# Altium footprint library Reflow3D1411sep.PcbLib: 657 footprints (part 16 of 42)
Each footprint in its own frame and in the unit in brackets; x right, y up, seen from the top. Pads: shape width x height; smd on the part's side, far side on the other; paste and mask are expansions set on the pad; w line width, h text height; cw(c..) or ccw(c..) is an arc to the next point about the centre after c.
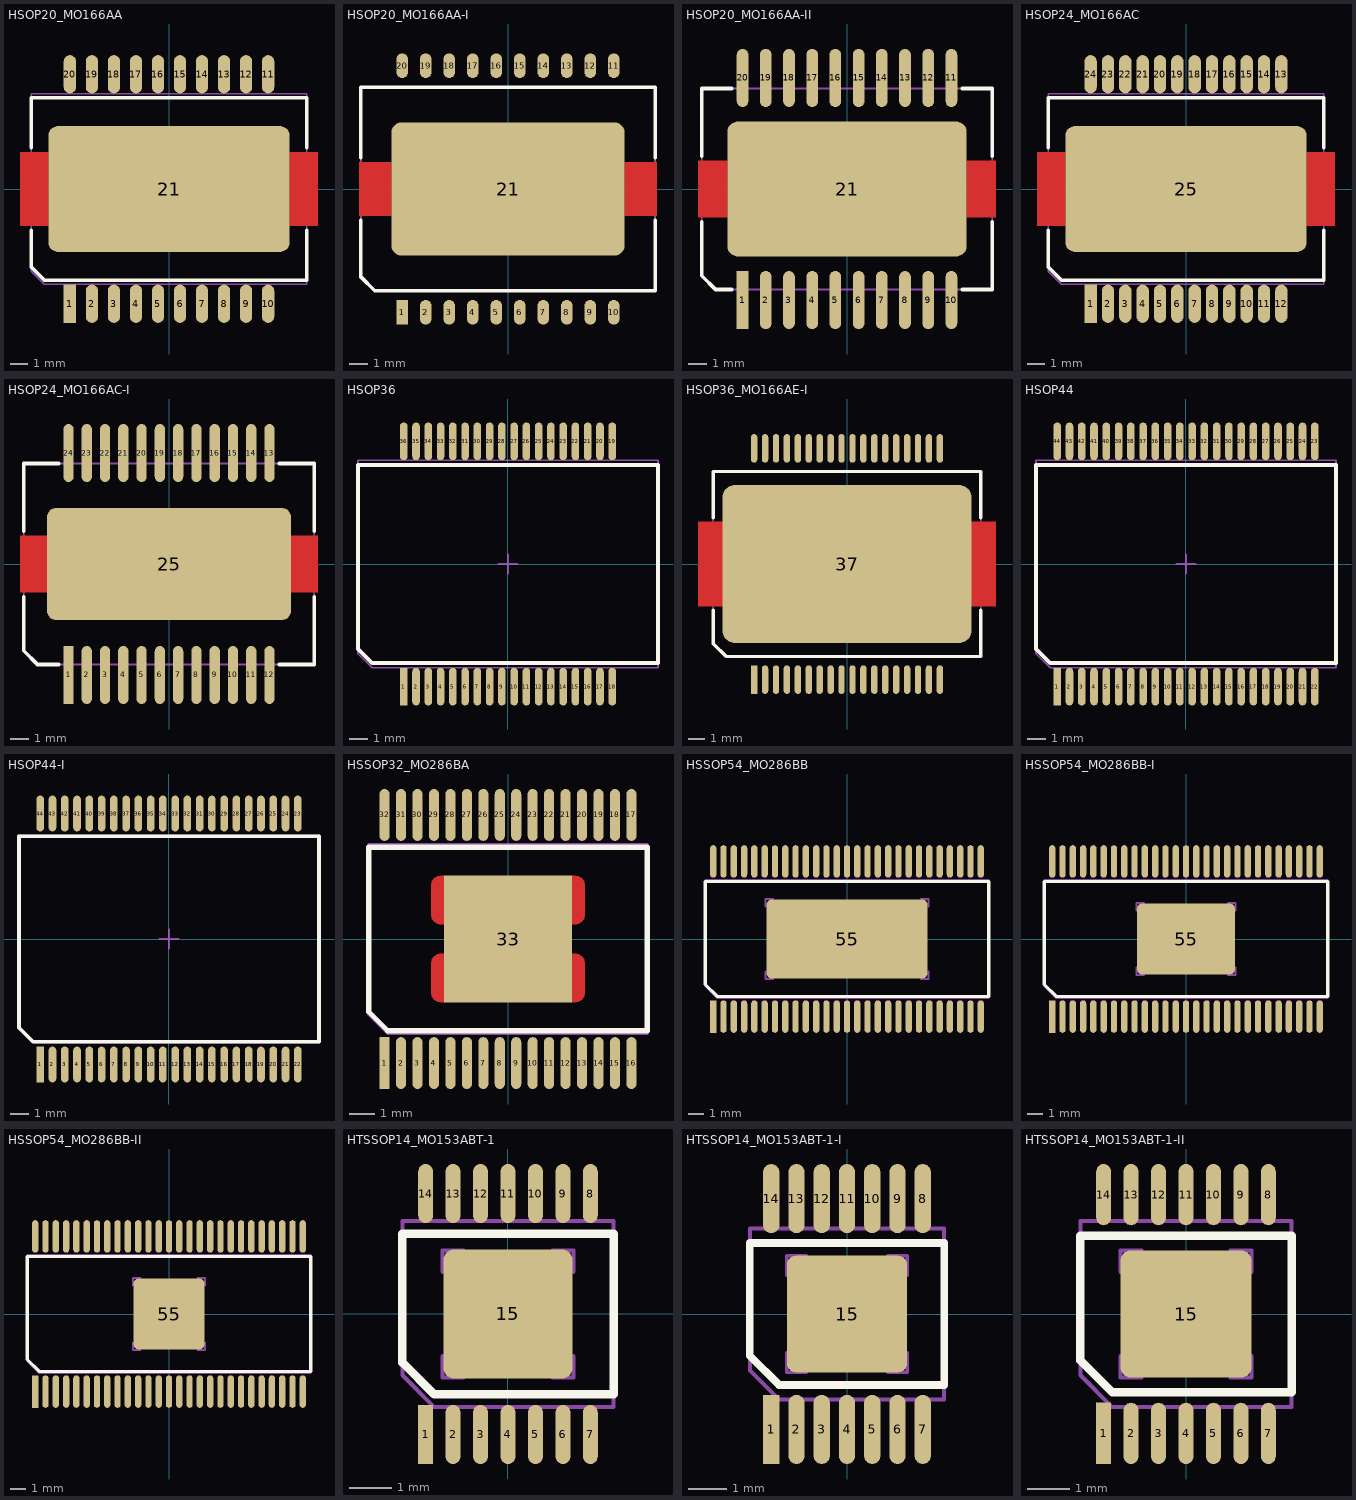
[diagram p15: the footprints below, top view; thin cyan lines are the x and y axes]

## HSOP20_MO166AA [mm] "www.intersil.com, M20.433.pdf; www.freescale.com, MC33186DHTAD.pdf; www.jedec.org, Mo-166D.pdf"
height 3.35
pads (21):
  rect 0.71x2.21 smd mask+0.075: 1(-5.715,-6.615)
  oval 0.71x2.21 smd mask+0.075: 2(-4.445,-6.615) 3(-3.175,-6.615) 4(-1.905,-6.615) 5(-0.635,-6.615) 6(0.635,-6.615) 7(1.905,-6.615) 8(3.175,-6.615) 9(4.445,-6.615) 10(5.715,-6.615) 11(5.715,6.615) 12(4.445,6.615) 13(3.175,6.615) 14(1.905,6.615) 15(0.635,6.615) 16(-0.635,6.615) 17(-1.905,6.615) 18(-3.175,6.615) 19(-4.445,6.615) 20(-5.715,6.615)
  rrect15% 13.92x7.26 smd paste-25.4 mask+0.075: 21(0,0)
Top Layer:
  region: -8.575,-2.11 -6.96,-2.11 -6.96,2.11 -8.575,2.11
  region: 8.575,2.11 6.96,2.11 6.96,-2.11 8.575,-2.11
Top Overlay:
  lines w0.2: -7.95,-2.375 -7.95,-4.5 -7.2,-5.25 7.95,-5.25 7.95,-2.375 ; -7.95,2.375 -7.95,5.25 7.95,5.25 7.95,2.375
Top Paste:
  drawing of 45 lines, arcs and shapes, not listed
Top Solder:
  region: -8.65,-2.185 -7.035,-2.185 -7.035,2.185 -8.65,2.185
  region: 8.65,2.185 7.035,2.185 7.035,-2.185 8.65,-2.185
Mechanical 13:
  lines w0.1: -6.4,-2.5 -6.4,-3 -5.9,-3 ; -6.4,2.5 -6.4,3 -5.9,3 ; 5.9,-3 6.4,-3 6.4,-2.5 ; 5.9,3 6.4,3 6.4,2.5 ; -7.95,-4.75 -7.95,5.5 7.95,5.5 7.95,-5.5 -7.2,-5.5 -7.95,-4.75
Mechanical 15:
  lines w0.1: -0.5,0 0.5,0 ; 0,-0.5 0,0.5
3D body: height 3.6, standoff 0, extent -8,-5.55 8,5.55

## HSOP20_MO166AA-I [mm] "www.onsemi.com, 525AB.PDF; www.freescale.com, MC33186DHTAD.pdf"
height 3.2
pads (21):
  rect 0.62x1.33 smd mask+0.075: 1(-5.715,-6.665)
  oval 0.62x1.33 smd mask+0.075: 2(-4.445,-6.665) 3(-3.175,-6.665) 4(-1.905,-6.665) 5(-0.635,-6.665) 6(0.635,-6.665) 7(1.905,-6.665) 8(3.175,-6.665) 9(4.445,-6.665) 10(5.715,-6.665) 11(5.715,6.665) 12(4.445,6.665) 13(3.175,6.665) 14(1.905,6.665) 15(0.635,6.665) 16(-0.635,6.665) 17(-1.905,6.665) 18(-3.175,6.665) 19(-4.445,6.665) 20(-5.715,6.665)
  rrect15% 12.6x7.2 smd paste-25.4 mask+0.075: 21(0,0)
Top Layer:
  region: -8.03,-1.45 -6.3,-1.45 -6.3,1.45 -8.03,1.45
  region: 6.3,-1.45 8.03,-1.45 8.03,1.45 6.3,1.45
Top Overlay:
  lines w0.2: -7.95,-1.7 -7.95,-4.75 -7.2,-5.5 7.95,-5.5 7.95,-1.7 ; -7.95,1.7 -7.95,5.5 7.95,5.5 7.95,1.7
Top Paste:
  drawing of 45 lines, arcs and shapes, not listed
Top Solder:
  region: -8.105,-1.525 -6.375,-1.525 -6.375,1.525 -8.105,1.525
  region: 6.375,-1.525 8.105,-1.525 8.105,1.525 6.375,1.525
Mechanical 13:
  lines w0.1: -6.075,-2.9 -6.075,-3.4 -5.575,-3.4 ; -6.075,2.9 -6.075,3.4 -5.575,3.4 ; 5.575,-3.4 6.075,-3.4 6.075,-2.9 ; 5.575,3.4 6.075,3.4 6.075,2.9 ; -7.95,-4.75 -7.95,5.5 7.95,5.5 7.95,-5.5 -7.2,-5.5 -7.95,-4.75
Mechanical 15:
  lines w0.1: -0.5,0 0.5,0 ; 0,-0.5 0,0.5
3D body: height 3.4, standoff 0, extent -8,-5.55 8,5.55

## HSOP20_MO166AA-II [mm] "www.cirrus.com, Apex_Pkg_DK_E.pdf; www.freescale.com, MC33186DHTAD.pdf"
height 3.2
pads (21):
  rect 0.64x3.18 smd mask+0.075: 1(-5.715,-6.08)
  oval 0.64x3.18 smd mask+0.075: 2(-4.445,-6.08) 3(-3.175,-6.08) 4(-1.905,-6.08) 5(-0.635,-6.08) 6(0.635,-6.08) 7(1.905,-6.08) 8(3.175,-6.08) 9(4.445,-6.08) 10(5.715,-6.08) 11(5.715,6.08) 12(4.445,6.08) 13(3.175,6.08) 14(1.905,6.08) 15(0.635,6.08) 16(-0.635,6.08) 17(-1.905,6.08) 18(-3.175,6.08) 19(-4.445,6.08) 20(-5.715,6.08)
  rrect15% 13.1x7.38 smd paste-25.4 mask+0.075: 21(0,0)
Top Layer:
  region: -8.135,-1.535 -6.555,-1.535 -6.555,1.535 -8.135,1.535
  region: 8.135,1.535 6.555,1.535 6.555,-1.535 8.135,-1.535
Top Overlay:
  lines w0.2: -7.95,-1.8 -7.95,-4.75 -7.2,-5.5 -6.3,-5.5 ; -7.95,1.8 -7.95,5.5 -6.3,5.5 ; 6.3,-5.5 7.95,-5.5 7.95,-1.8 ; 6.3,5.5 7.95,5.5 7.95,1.8
Top Paste:
  drawing of 45 lines, arcs and shapes, not listed
Top Solder:
  region: -8.21,-1.61 -6.63,-1.61 -6.63,1.61 -8.21,1.61
  region: 8.21,1.61 6.63,1.61 6.63,-1.61 8.21,-1.61
Mechanical 13:
  lines w0.1: -5.5,-2.75 -5.5,-3.25 -5,-3.25 ; -5.5,2.75 -5.5,3.25 -5,3.25 ; 5,-3.25 5.5,-3.25 5.5,-2.75 ; 5,3.25 5.5,3.25 5.5,2.75 ; -7.95,-4.75 -7.2,-5.5 7.95,-5.5 7.95,5.5 -7.95,5.5 -7.95,-4.75
Mechanical 15:
  lines w0.1: -0.5,0 0.5,0 ; 0,-0.5 0,0.5
3D body: height 3.4, standoff 0, extent -8,-5.55 8,5.55

## HSOP24_MO166AC [mm] "www.intersil.com, M24.433.pdf; www.freescale.com, MC33186DHTAD.pdf"
height 3.35
pads (25):
  rect 0.71x2.21 smd mask+0.075: 1(-5.5,-6.615)
  oval 0.71x2.21 smd mask+0.075: 2(-4.5,-6.615) 3(-3.5,-6.615) 4(-2.5,-6.615) 5(-1.5,-6.615) 6(-0.5,-6.615) 7(0.5,-6.615) 8(1.5,-6.615) 9(2.5,-6.615) 10(3.5,-6.615) 11(4.5,-6.615) 12(5.5,-6.615) 13(5.5,6.615) 14(4.5,6.615) 15(3.5,6.615) 16(2.5,6.615) 17(1.5,6.615) 18(0.5,6.615) 19(-0.5,6.615) 20(-1.5,6.615) 21(-2.5,6.615) 22(-3.5,6.615) 23(-4.5,6.615) 24(-5.5,6.615)
  rrect15% 13.92x7.26 smd paste-25.4 mask+0.075: 25(0,0)
Top Layer:
  region: -8.575,-2.11 -6.96,-2.11 -6.96,2.11 -8.575,2.11
  region: 8.575,2.11 6.96,2.11 6.96,-2.11 8.575,-2.11
Top Overlay:
  lines w0.2: -7.95,-2.375 -7.95,-4.5 -7.2,-5.25 7.95,-5.25 7.95,-2.375 ; -7.95,2.375 -7.95,5.25 7.95,5.25 7.95,2.375
Top Paste:
  drawing of 45 lines, arcs and shapes, not listed
Top Solder:
  region: -8.65,-2.185 -7.035,-2.185 -7.035,2.185 -8.65,2.185
  region: 8.65,2.185 7.035,2.185 7.035,-2.185 8.65,-2.185
Mechanical 13:
  lines w0.1: -6.4,-2.5 -6.4,-3 -5.9,-3 ; -6.4,2.5 -6.4,3 -5.9,3 ; 5.9,-3 6.4,-3 6.4,-2.5 ; 5.9,3 6.4,3 6.4,2.5 ; -7.95,-4.75 -7.95,5.5 7.95,5.5 7.95,-5.5 -7.2,-5.5 -7.95,-4.75
Mechanical 15:
  lines w0.1: -0.5,0 0.5,0 ; 0,-0.5 0,0.5
3D body: height 3.6, standoff 0, extent -8,-5.55 8,5.55

## HSOP24_MO166AC-I [mm] "www.cirrus.com, Apex_Pkg_DF.pdf; www.freescale.com, MC33186DHTAD.pdf; www.jedec.org, Mo-166D.pdf"
height 3.35
pads (25):
  rect 0.56x3.18 smd mask+0.075: 1(-5.5,-6.075)
  oval 0.56x3.18 smd mask+0.075: 2(-4.5,-6.075) 3(-3.5,-6.075) 4(-2.5,-6.075) 5(-1.5,-6.075) 6(-0.5,-6.075) 7(0.5,-6.075) 8(1.5,-6.075) 9(2.5,-6.075) 10(3.5,-6.075) 11(4.5,-6.075) 12(5.5,-6.075) 13(5.5,6.075) 14(4.5,6.075) 15(3.5,6.075) 16(2.5,6.075) 17(1.5,6.075) 18(0.5,6.075) 19(-0.5,6.075) 20(-1.5,6.075) 21(-2.5,6.075) 22(-3.5,6.075) 23(-4.5,6.075) 24(-5.5,6.075)
  rrect15% 13.34x6.13 smd paste-25.4 mask+0.075: 25(0,0)
Top Layer:
  region: 8.135,1.535 6.67,1.535 6.67,-1.535 8.135,-1.535
  region: -8.135,-1.535 -6.67,-1.535 -6.67,1.535 -8.135,1.535
Top Overlay:
  lines w0.2: -7.95,-1.8 -7.95,-4.75 -7.2,-5.5 -6.05,-5.5 ; -7.95,1.8 -7.95,5.5 -6.05,5.5 ; 6.05,-5.5 7.95,-5.5 7.95,-1.8 ; 6.05,5.5 7.95,5.5 7.95,1.8
Top Paste:
  drawing of 45 lines, arcs and shapes, not listed
Top Solder:
  region: 8.21,1.61 6.745,1.61 6.745,-1.61 8.21,-1.61
  region: -8.21,-1.61 -6.745,-1.61 -6.745,1.61 -8.21,1.61
Mechanical 13:
  lines w0.1: -5.5,-2.5 -5.5,-3 -5,-3 ; -5.5,2.5 -5.5,3 -5,3 ; 5,-3 5.5,-3 5.5,-2.5 ; 5,3 5.5,3 5.5,2.5 ; -7.95,-4.75 -7.95,5.5 7.95,5.5 7.95,-5.5 -7.2,-5.5 -7.95,-4.75
Mechanical 15:
  lines w0.1: -0.5,0 0.5,0 ; 0,-0.5 0,0.5
3D body: height 3.6, standoff 0, extent -8,-5.55 8,5.55

## HSOP36 [mm] "www.ti.com, tas5414a.pdf"
height 3.5
pads (36):
  rect 0.4x2 smd mask+0.05: 1(-5.525,-6.5)
  oval 0.4x2 smd mask+0.05: 2(-4.875,-6.5) 3(-4.225,-6.5) 4(-3.575,-6.5) 5(-2.925,-6.5) 6(-2.275,-6.5) 7(-1.625,-6.5) 8(-0.975,-6.5) 9(-0.325,-6.5) 10(0.325,-6.5) 11(0.975,-6.5) 12(1.625,-6.5) 13(2.275,-6.5) 14(2.925,-6.5) 15(3.575,-6.5) 16(4.225,-6.5) 17(4.875,-6.5) 18(5.525,-6.5) 19(5.525,6.5) 20(4.875,6.5) 21(4.225,6.5) 22(3.575,6.5) 23(2.925,6.5) 24(2.275,6.5) 25(1.625,6.5) 26(0.975,6.5) 27(0.325,6.5) 28(-0.325,6.5) 29(-0.975,6.5) 30(-1.625,6.5) 31(-2.275,6.5) 32(-2.925,6.5) 33(-3.575,6.5) 34(-4.225,6.5) 35(-4.875,6.5) 36(-5.525,6.5)
Top Overlay:
  lines w0.2: -7.95,-4.5 -7.2,-5.25 7.95,-5.25 7.95,5.25 -7.95,5.25 -7.95,-4.5
Mechanical 13:
  lines w0.1: -7.95,-4.75 -7.95,5.5 7.95,5.5 7.95,-5.5 -7.2,-5.5 -7.95,-4.75
Mechanical 15:
  lines w0.1: -0.5,0 0.5,0 ; 0,-0.5 0,0.5
3D body: height 3.6, standoff 0, extent -8,-5.55 8,5.55

## HSOP36_MO166AE-I [mm] "www.st.com, CD00003801.pdf; www.freescale.com, MC33186DHTAD.pdf; www.jedec.org, Mo-166D.pdf"
height 3.35
pads (37):
  rect 0.38x1.7 smd mask+0.075: 1(-5.525,-6.88)
  oval 0.38x1.7 smd mask+0.075: 2(-4.875,-6.88) 3(-4.225,-6.88) 4(-3.575,-6.88) 5(-2.925,-6.88) 6(-2.275,-6.88) 7(-1.625,-6.88) 8(-0.975,-6.88) 9(-0.325,-6.88) 10(0.325,-6.88) 11(0.975,-6.88) 12(1.625,-6.88) 13(2.275,-6.88) 14(2.925,-6.88) 15(3.575,-6.88) 16(4.225,-6.88) 17(4.875,-6.88) 18(5.525,-6.88) 19(5.525,6.88) 20(4.875,6.88) 21(4.225,6.88) 22(3.575,6.88) 23(2.925,6.88) 24(2.275,6.88) 25(1.625,6.88) 26(0.975,6.88) 27(0.325,6.88) 28(-0.325,6.88) 29(-0.975,6.88) 30(-1.625,6.88) 31(-2.275,6.88) 32(-2.925,6.88) 33(-3.575,6.88) 34(-4.225,6.88) 35(-4.875,6.88) 36(-5.525,6.88)
  rrect15% 14.8x9.4 smd paste-25.4 mask+0.075: 37(0,0)
Top Layer:
  region: -8.85,-2.5 -7.4,-2.5 -7.4,2.5 -8.85,2.5
  region: 8.85,2.5 7.4,2.5 7.4,-2.5 8.85,-2.5
Top Overlay:
  lines w0.2: -7.95,-2.75 -7.95,-4.75 -7.2,-5.5 7.95,-5.5 7.95,-2.75 ; -7.95,2.75 -7.95,5.5 7.95,5.5 7.95,2.75
Top Paste:
  drawing of 45 lines, arcs and shapes, not listed
Top Solder:
  region: -8.925,-2.575 -7.475,-2.575 -7.475,2.575 -8.925,2.575
  region: 8.925,2.575 7.475,2.575 7.475,-2.575 8.925,-2.575
Mechanical 13:
  lines w0.1: -4.8,-2.5 -4.8,-3 -4.3,-3 ; -4.8,2.5 -4.8,3 -4.3,3 ; 4.3,-3 4.8,-3 4.8,-2.5 ; 4.3,3 4.8,3 4.8,2.5 ; -7.95,-4.75 -7.95,5.5 7.95,5.5 7.95,-5.5 -7.2,-5.5 -7.95,-4.75
Mechanical 15:
  lines w0.1: -0.5,0 0.5,0 ; 0,-0.5 0,0.5
3D body: height 3.6, standoff 0, extent -8,-5.55 8,5.55

## HSOP44 [mm] "www.ti.com, tas5414a.pdf"
height 3.5
pads (44):
  rect 0.4x2 smd mask+0.05: 1(-6.825,-6.5)
  oval 0.4x2 smd mask+0.05: 2(-6.175,-6.5) 3(-5.525,-6.5) 4(-4.875,-6.5) 5(-4.225,-6.5) 6(-3.575,-6.5) 7(-2.925,-6.5) 8(-2.275,-6.5) 9(-1.625,-6.5) 10(-0.975,-6.5) 11(-0.325,-6.5) 12(0.325,-6.5) 13(0.975,-6.5) 14(1.625,-6.5) 15(2.275,-6.5) 16(2.925,-6.5) 17(3.575,-6.5) 18(4.225,-6.5) 19(4.875,-6.5) 20(5.525,-6.5) 21(6.175,-6.5) 22(6.825,-6.5) 23(6.825,6.5) 24(6.175,6.5) 25(5.525,6.5) 26(4.875,6.5) 27(4.225,6.5) 28(3.575,6.5) 29(2.925,6.5) 30(2.275,6.5) 31(1.625,6.5) 32(0.975,6.5) 33(0.325,6.5) 34(-0.325,6.5) 35(-0.975,6.5) 36(-1.625,6.5) 37(-2.275,6.5) 38(-2.925,6.5) 39(-3.575,6.5) 40(-4.225,6.5) 41(-4.875,6.5) 42(-5.525,6.5) 43(-6.175,6.5) 44(-6.825,6.5)
Top Overlay:
  lines w0.2: -7.95,-4.5 -7.95,5.25 7.95,5.25 7.95,-5.25 -7.2,-5.25 -7.95,-4.5
Mechanical 13:
  lines w0.1: -7.95,-4.75 -7.2,-5.5 7.95,-5.5 7.95,5.5 -7.95,5.5 -7.95,-4.75
Mechanical 15:
  lines w0.1: -0.5,0 0.5,0 ; 0,-0.5 0,0.5
3D body: height 3.6, standoff 0, extent -8,-5.55 8,5.55

## HSOP44-I [mm] "www.cirrus.com, Apex_Pkg_HU.pdf"
height 3.35
pads (44):
  rect 0.4x1.9 smd mask+0.05: 1(-6.825,-6.65)
  oval 0.4x1.9 smd mask+0.05: 2(-6.175,-6.65) 3(-5.525,-6.65) 4(-4.875,-6.65) 5(-4.225,-6.65) 6(-3.575,-6.65) 7(-2.925,-6.65) 8(-2.275,-6.65) 9(-1.625,-6.65) 10(-0.975,-6.65) 11(-0.325,-6.65) 12(0.325,-6.65) 13(0.975,-6.65) 14(1.625,-6.65) 15(2.275,-6.65) 16(2.925,-6.65) 17(3.575,-6.65) 18(4.225,-6.65) 19(4.875,-6.65) 20(5.525,-6.65) 21(6.175,-6.65) 22(6.825,-6.65) 23(6.825,6.65) 24(6.175,6.65) 25(5.525,6.65) 26(4.875,6.65) 27(4.225,6.65) 28(3.575,6.65) 29(2.925,6.65) 30(2.275,6.65) 31(1.625,6.65) 32(0.975,6.65) 33(0.325,6.65) 34(-0.325,6.65) 35(-0.975,6.65) 36(-1.625,6.65) 37(-2.275,6.65) 38(-2.925,6.65) 39(-3.575,6.65) 40(-4.225,6.65) 41(-4.875,6.65) 42(-5.525,6.65) 43(-6.175,6.65) 44(-6.825,6.65)
Top Overlay:
  lines w0.2: -7.95,-4.7 -7.95,5.45 7.95,5.45 7.95,-5.45 -7.2,-5.45 -7.95,-4.7
Mechanical 13:
  lines w0.1: -7.95,-4.75 -7.2,-5.5 7.95,-5.5 7.95,5.5 -7.95,5.5 -7.95,-4.75
Mechanical 15:
  lines w0.1: -0.5,0 0.5,0 ; 0,-0.5 0,0.5
3D body: height 3.6, standoff 0, extent -8,-5.55 8,5.55

## HSSOP32_MO286BA [mm] "www.freescale.com, MC33996.pdf, AN2409.pdf"
height 2.5
pads (33):
  rect 0.4x2.05 smd mask+0.05: 1(-4.875,-4.9)
  oval 0.4x2.05 smd mask+0.05: 2(-4.225,-4.9) 3(-3.575,-4.9) 4(-2.925,-4.9) 5(-2.275,-4.9) 6(-1.625,-4.9) 7(-0.975,-4.9) 8(-0.325,-4.9) 9(0.325,-4.9) 10(0.975,-4.9) 11(1.625,-4.9) 12(2.275,-4.9) 13(2.925,-4.9) 14(3.575,-4.9) 15(4.225,-4.9) 16(4.875,-4.9) 17(4.875,4.9) 18(4.225,4.9) 19(3.575,4.9) 20(2.925,4.9) 21(2.275,4.9) 22(1.625,4.9) 23(0.975,4.9) 24(0.325,4.9) 25(-0.325,4.9) 26(-0.975,4.9) 27(-1.625,4.9) 28(-2.275,4.9) 29(-2.925,4.9) 30(-3.575,4.9) 31(-4.225,4.9) 32(-4.875,4.9)
  rect 5.05x5 smd paste-25.4 mask+0.075: 33(0,0)
Top Layer:
  region: 2.525,-2.5 2.65,-2.507 2.796,-2.478 2.92,-2.395 3.003,-2.271 3.032,-2.125 3.025,-2.125 3.032,-0.95 3.003,-0.804 2.92,-0.68 2.796,-0.597 2.65,-0.568 2.65,-0.575 2.525,-0.575
  region: -2.525,2.5 -2.65,2.507 -2.796,2.478 -2.92,2.395 -3.003,2.271 -3.032,2.125 -3.025,2.125 -3.032,0.95 -3.003,0.804 -2.92,0.68 -2.796,0.597 -2.65,0.568 -2.65,0.575 -2.525,0.575
  region: 2.525,0.575 2.65,0.568 2.796,0.597 2.92,0.68 3.003,0.804 3.032,0.95 3.025,0.95 3.032,2.125 3.003,2.271 2.92,2.395 2.796,2.478 2.65,2.507 2.65,2.5 2.525,2.5
  region: -2.525,-0.575 -2.65,-0.568 -2.796,-0.597 -2.92,-0.68 -3.003,-0.804 -3.032,-0.95 -3.025,-0.95 -3.032,-2.125 -3.003,-2.271 -2.92,-2.395 -2.796,-2.478 -2.65,-2.507 -2.65,-2.5 -2.525,-2.5
Top Overlay:
  lines w0.2: -5.5,-2.875 -4.75,-3.625 5.5,-3.625 5.5,3.625 -5.5,3.625 -5.5,-2.875
Top Paste:
  region: -2.945,2.46 -2.945,0.575 -2.445,0.575 -2.445,0.15 2.445,0.15 2.445,0.575 2.945,0.575 2.945,2.46
  region: 2.945,-2.46 2.945,-0.575 2.445,-0.575 2.445,-0.15 -2.445,-0.15 -2.445,-0.575 -2.945,-0.575 -2.945,-2.46
Top Solder:
  region: 2.6,-2.575 2.65,-2.584 2.826,-2.549 2.974,-2.449 3.074,-2.301 3.109,-2.125 3.1,-2.125 3.109,-0.95 3.074,-0.774 2.974,-0.626 2.826,-0.526 2.65,-0.491 2.65,-0.5 2.6,-0.5
  region: -2.6,2.575 -2.65,2.584 -2.826,2.549 -2.974,2.449 -3.074,2.301 -3.109,2.125 -3.1,2.125 -3.109,0.95 -3.074,0.774 -2.974,0.626 -2.826,0.526 -2.65,0.491 -2.65,0.5 -2.6,0.5
  region: 2.6,0.5 2.65,0.491 2.826,0.526 2.974,0.626 3.074,0.774 3.109,0.95 3.1,0.95 3.109,2.125 3.074,2.301 2.974,2.449 2.826,2.549 2.65,2.584 2.65,2.575 2.6,2.575
  region: -2.6,-0.5 -2.65,-0.491 -2.826,-0.526 -2.974,-0.626 -3.074,-0.774 -3.109,-0.95 -3.1,-0.95 -3.109,-2.125 -3.074,-2.301 -2.974,-2.449 -2.826,-2.549 -2.65,-2.584 -2.65,-2.575 -2.6,-2.575
Mechanical 13:
  lines w0.1: -2.85,-1.8 -2.85,-2.3 -2.35,-2.3 ; -2.85,1.8 -2.85,2.3 -2.35,2.3 ; 2.35,-2.3 2.85,-2.3 2.85,-1.8 ; 2.35,2.3 2.85,2.3 2.85,1.8 ; -5.5,-3 -5.5,3.75 5.5,3.75 5.5,-3.75 -4.75,-3.75 -5.5,-3
Mechanical 15:
  lines w0.1: -0.5,0 0.5,0 ; 0,-0.5 0,0.5
3D body: height 2.65, standoff 0, extent -5.55,-3.8 5.55,3.8

## HSSOP54_MO286BB [mm] "www.freescale.com, AN2409.pdf"
height 2.5
pads (55):
  rect 0.4x2.05 smd mask+0.05: 1(-8.45,-4.9)
  oval 0.4x2.05 smd mask+0.05: 2(-7.8,-4.9) 3(-7.15,-4.9) 4(-6.5,-4.9) 5(-5.85,-4.9) 6(-5.2,-4.9) 7(-4.55,-4.9) 8(-3.9,-4.9) 9(-3.25,-4.9) 10(-2.6,-4.9) 11(-1.95,-4.9) 12(-1.3,-4.9) 13(-0.65,-4.9) 14(0,-4.9) 15(0.65,-4.9) 16(1.3,-4.9) 17(1.95,-4.9) 18(2.6,-4.9) 19(3.25,-4.9) 20(3.9,-4.9) 21(4.55,-4.9) 22(5.2,-4.9) 23(5.85,-4.9) 24(6.5,-4.9) 25(7.15,-4.9) 26(7.8,-4.9) 27(8.45,-4.9) 28(8.45,4.9) 29(7.8,4.9) 30(7.15,4.9) 31(6.5,4.9) 32(5.85,4.9) 33(5.2,4.9) 34(4.55,4.9) 35(3.9,4.9) 36(3.25,4.9) 37(2.6,4.9) 38(1.95,4.9) 39(1.3,4.9) 40(0.65,4.9) 41(0,4.9) 42(-0.65,4.9) 43(-1.3,4.9) 44(-1.95,4.9) 45(-2.6,4.9) 46(-3.25,4.9) 47(-3.9,4.9) 48(-4.55,4.9) 49(-5.2,4.9) 50(-5.85,4.9) 51(-6.5,4.9) 52(-7.15,4.9) 53(-7.8,4.9) 54(-8.45,4.9)
  rrect15% 10.2x5 smd paste-25.4 mask+0.075: 55(0,0)
Top Overlay:
  lines w0.2: -8.95,-2.875 -8.95,3.625 8.95,3.625 8.95,-3.625 -8.2,-3.625 -8.95,-2.875
Top Paste:
  region: -1.58,2.43 -1.58,0.15 1.58,0.15 1.58,2.43
  region: 1.58,-2.43 1.58,-0.15 -1.58,-0.15 -1.58,-2.43
  region: -1.88,-2.43 -1.88,-0.15 -5.04,-0.15 -5.04,-2.43
  region: -5.04,2.43 -5.04,0.15 -1.88,0.15 -1.88,2.43
  region: 5.04,-2.43 5.04,-0.15 1.88,-0.15 1.88,-2.43
  region: 1.88,2.43 1.88,0.15 5.04,0.15 5.04,2.43
Mechanical 13:
  lines w0.1: -5.15,-2.025 -5.15,-2.525 -4.65,-2.525 ; -5.15,2.025 -5.15,2.525 -4.65,2.525 ; 4.65,-2.525 5.15,-2.525 5.15,-2.025 ; 4.65,2.525 5.15,2.525 5.15,2.025 ; -8.95,-3 -8.95,3.75 8.95,3.75 8.95,-3.75 -8.2,-3.75 -8.95,-3
Mechanical 15:
  lines w0.1: -0.5,0 0.5,0 ; 0,-0.5 0,0.5
3D body: height 2.65, standoff 0, extent -9,-3.8 9,3.8

## HSSOP54_MO286BB-I [mm] "www.freescale.com, AN2409.pdf"
height 2.5
pads (55):
  rect 0.4x2.05 smd mask+0.05: 1(-8.45,-4.9)
  oval 0.4x2.05 smd mask+0.05: 2(-7.8,-4.9) 3(-7.15,-4.9) 4(-6.5,-4.9) 5(-5.85,-4.9) 6(-5.2,-4.9) 7(-4.55,-4.9) 8(-3.9,-4.9) 9(-3.25,-4.9) 10(-2.6,-4.9) 11(-1.95,-4.9) 12(-1.3,-4.9) 13(-0.65,-4.9) 14(0,-4.9) 15(0.65,-4.9) 16(1.3,-4.9) 17(1.95,-4.9) 18(2.6,-4.9) 19(3.25,-4.9) 20(3.9,-4.9) 21(4.55,-4.9) 22(5.2,-4.9) 23(5.85,-4.9) 24(6.5,-4.9) 25(7.15,-4.9) 26(7.8,-4.9) 27(8.45,-4.9) 28(8.45,4.9) 29(7.8,4.9) 30(7.15,4.9) 31(6.5,4.9) 32(5.85,4.9) 33(5.2,4.9) 34(4.55,4.9) 35(3.9,4.9) 36(3.25,4.9) 37(2.6,4.9) 38(1.95,4.9) 39(1.3,4.9) 40(0.65,4.9) 41(0,4.9) 42(-0.65,4.9) 43(-1.3,4.9) 44(-1.95,4.9) 45(-2.6,4.9) 46(-3.25,4.9) 47(-3.9,4.9) 48(-4.55,4.9) 49(-5.2,4.9) 50(-5.85,4.9) 51(-6.5,4.9) 52(-7.15,4.9) 53(-7.8,4.9) 54(-8.45,4.9)
  rrect15% 6.2x4.5 smd paste-25.4 mask+0.075: 55(0,0)
Top Overlay:
  lines w0.2: -8.95,-2.875 -8.2,-3.625 8.95,-3.625 8.95,3.625 -8.95,3.625 -8.95,-2.875
Top Paste:
  region: -0.15,0.15 -0.15,2.17 -3.025,2.17 -3.025,0.15
  region: 0.15,-0.15 0.15,-2.17 3.025,-2.17 3.025,-0.15
  region: -0.15,-2.17 -0.15,-0.15 -3.025,-0.15 -3.025,-2.17
  region: 0.15,2.17 0.15,0.15 3.025,0.15 3.025,2.17
Mechanical 13:
  lines w0.1: -3.125,-1.775 -3.125,-2.275 -2.625,-2.275 ; -3.125,1.775 -3.125,2.275 -2.625,2.275 ; 2.625,-2.275 3.125,-2.275 3.125,-1.775 ; 2.625,2.275 3.125,2.275 3.125,1.775 ; -8.95,-3 -8.2,-3.75 8.95,-3.75 8.95,3.75 -8.95,3.75 -8.95,-3
Mechanical 15:
  lines w0.1: -0.5,0 0.5,0 ; 0,-0.5 0,0.5
3D body: height 2.65, standoff 0, extent -9,-3.8 9,3.8

## HSSOP54_MO286BB-II [mm] "www.freescale.com, AN2409.pdf"
height 2.5
pads (55):
  rect 0.4x2.05 smd mask+0.05: 1(-8.45,-4.9)
  oval 0.4x2.05 smd mask+0.05: 2(-7.8,-4.9) 3(-7.15,-4.9) 4(-6.5,-4.9) 5(-5.85,-4.9) 6(-5.2,-4.9) 7(-4.55,-4.9) 8(-3.9,-4.9) 9(-3.25,-4.9) 10(-2.6,-4.9) 11(-1.95,-4.9) 12(-1.3,-4.9) 13(-0.65,-4.9) 14(0,-4.9) 15(0.65,-4.9) 16(1.3,-4.9) 17(1.95,-4.9) 18(2.6,-4.9) 19(3.25,-4.9) 20(3.9,-4.9) 21(4.55,-4.9) 22(5.2,-4.9) 23(5.85,-4.9) 24(6.5,-4.9) 25(7.15,-4.9) 26(7.8,-4.9) 27(8.45,-4.9) 28(8.45,4.9) 29(7.8,4.9) 30(7.15,4.9) 31(6.5,4.9) 32(5.85,4.9) 33(5.2,4.9) 34(4.55,4.9) 35(3.9,4.9) 36(3.25,4.9) 37(2.6,4.9) 38(1.95,4.9) 39(1.3,4.9) 40(0.65,4.9) 41(0,4.9) 42(-0.65,4.9) 43(-1.3,4.9) 44(-1.95,4.9) 45(-2.6,4.9) 46(-3.25,4.9) 47(-3.9,4.9) 48(-4.55,4.9) 49(-5.2,4.9) 50(-5.85,4.9) 51(-6.5,4.9) 52(-7.15,4.9) 53(-7.8,4.9) 54(-8.45,4.9)
  rrect15% 4.5x4.5 smd paste-25.4 mask+0.075: 55(0,0)
Top Overlay:
  lines w0.2: -8.95,-2.875 -8.2,-3.625 8.95,-3.625 8.95,3.625 -8.95,3.625 -8.95,-2.875
Top Paste:
  region: -2.17,2.17 -2.17,0.15 2.17,0.15 2.17,2.17
  region: 2.17,-2.17 2.17,-0.15 -2.17,-0.15 -2.17,-2.17
Mechanical 13:
  lines w0.1: -2.275,-1.775 -2.275,-2.275 -1.775,-2.275 ; -2.275,1.775 -2.275,2.275 -1.775,2.275 ; 1.775,-2.275 2.275,-2.275 2.275,-1.775 ; 1.775,2.275 2.275,2.275 2.275,1.775 ; -8.95,-3 -8.2,-3.75 8.95,-3.75 8.95,3.75 -8.95,3.75 -8.95,-3
Mechanical 15:
  lines w0.1: -0.5,0 0.5,0 ; 0,-0.5 0,0.5
3D body: height 2.65, standoff 0, extent -9,-3.8 9,3.8

## HTSSOP14_MO153ABT-1 [mm] "www.maxim-ic.com, 21-0108.PDF, 90-0119.PDF"
height 1
pads (15):
  rect 0.35x1.4 smd mask+0.075: 1(-1.95,-2.85)
  oval 0.35x1.4 smd mask+0.075: 2(-1.3,-2.85) 3(-0.65,-2.85) 4(0,-2.85) 5(0.65,-2.85) 6(1.3,-2.85) 7(1.95,-2.85) 8(1.95,2.85) 9(1.3,2.85) 10(0.65,2.85) 11(0,2.85) 12(-0.65,2.85) 13(-1.3,2.85) 14(-1.95,2.85)
  rrect15% 3.05x3.05 smd mask+0.075: 15(0,0)
Top Overlay:
  lines w0.2: -2.5,-1.15 -2.5,1.9 2.5,1.9 2.5,-1.9 -1.75,-1.9 -2.5,-1.15
Mechanical 13:
  lines w0.1: -1.55,-1 -1.55,-1.5 -1.05,-1.5 ; -1.55,1 -1.55,1.5 -1.05,1.5 ; 1.05,-1.5 1.55,-1.5 1.55,-1 ; 1.05,1.5 1.55,1.5 1.55,1 ; -2.5,-1.45 -1.75,-2.2 2.5,-2.2 2.5,2.2 -2.5,2.2 -2.5,-1.45
Mechanical 15:
  lines w0.1: -0.5,0 0.5,0 ; 0,-0.5 0,0.5
3D body: height 1.1, standoff 0, extent -2.55,-2.25 2.55,2.25

## HTSSOP14_MO153ABT-1-I [mm] "www.national.com, mxa14a.pdf"
height 1
pads (15):
  rect 0.42x1.78 smd mask+0.05: 1(-1.95,-2.97)
  oval 0.42x1.78 smd mask+0.05: 2(-1.3,-2.97) 3(-0.65,-2.97) 4(0,-2.97) 5(0.65,-2.97) 6(1.3,-2.97) 7(1.95,-2.97) 8(1.95,2.97) 9(1.3,2.97) 10(0.65,2.97) 11(0,2.97) 12(-0.65,2.97) 13(-1.3,2.97) 14(-1.95,2.97)
  rrect15% 3.1x3 smd mask+0.075: 15(0,0)
Top Overlay:
  lines w0.2: -2.5,-1.075 -2.5,1.825 2.5,1.825 2.5,-1.825 -1.75,-1.825 -2.5,-1.075
Mechanical 13:
  lines w0.1: -1.55,-1 -1.55,-1.5 -1.05,-1.5 ; -1.55,1 -1.55,1.5 -1.05,1.5 ; 1.05,-1.5 1.55,-1.5 1.55,-1 ; 1.05,1.5 1.55,1.5 1.55,1 ; -2.5,-1.45 -2.5,2.2 2.5,2.2 2.5,-2.2 -1.75,-2.2 -2.5,-1.45
Mechanical 15:
  lines w0.1: -0.5,0 0.5,0 ; 0,-0.5 0,0.5
3D body: height 1.1, standoff 0, extent -2.55,-2.25 2.55,2.25

## HTSSOP14_MO153ABT-1-II [mm] "www.intersil.com, M14.173b.pdf; www.jedec.org, MO-153f.pdf"
height 1
pads (15):
  rect 0.35x1.45 smd mask+0.075: 1(-1.95,-2.825)
  oval 0.35x1.45 smd mask+0.075: 2(-1.3,-2.825) 3(-0.65,-2.825) 4(0,-2.825) 5(0.65,-2.825) 6(1.3,-2.825) 7(1.95,-2.825) 8(1.95,2.825) 9(1.3,2.825) 10(0.65,2.825) 11(0,2.825) 12(-0.65,2.825) 13(-1.3,2.825) 14(-1.95,2.825)
  rrect15% 3.1x3 smd mask+0.075: 15(0,0)
Top Overlay:
  lines w0.2: -2.5,-1.1 -1.75,-1.85 2.5,-1.85 2.5,1.85 -2.5,1.85 -2.5,-1.1
Mechanical 13:
  lines w0.1: -1.55,-1 -1.55,-1.5 -1.05,-1.5 ; -1.55,1 -1.55,1.5 -1.05,1.5 ; 1.05,-1.5 1.55,-1.5 1.55,-1 ; 1.05,1.5 1.55,1.5 1.55,1 ; -2.5,-1.45 -1.75,-2.2 2.5,-2.2 2.5,2.2 -2.5,2.2 -2.5,-1.45
Mechanical 15:
  lines w0.1: -0.5,0 0.5,0 ; 0,-0.5 0,0.5
3D body: height 1.2, standoff 0, extent -2.55,-2.25 2.55,2.25